# Altium footprint library General.PCBLIB: 130 footprints (part 8 of 9)
Each footprint in its own frame and in the unit in brackets; x right, y up, seen from the top. Pads: shape width x height; smd on the part's side, far side on the other; paste and mask are expansions set on the pad; w line width, h text height; cw(c..) or ccw(c..) is an arc to the next point about the centre after c.
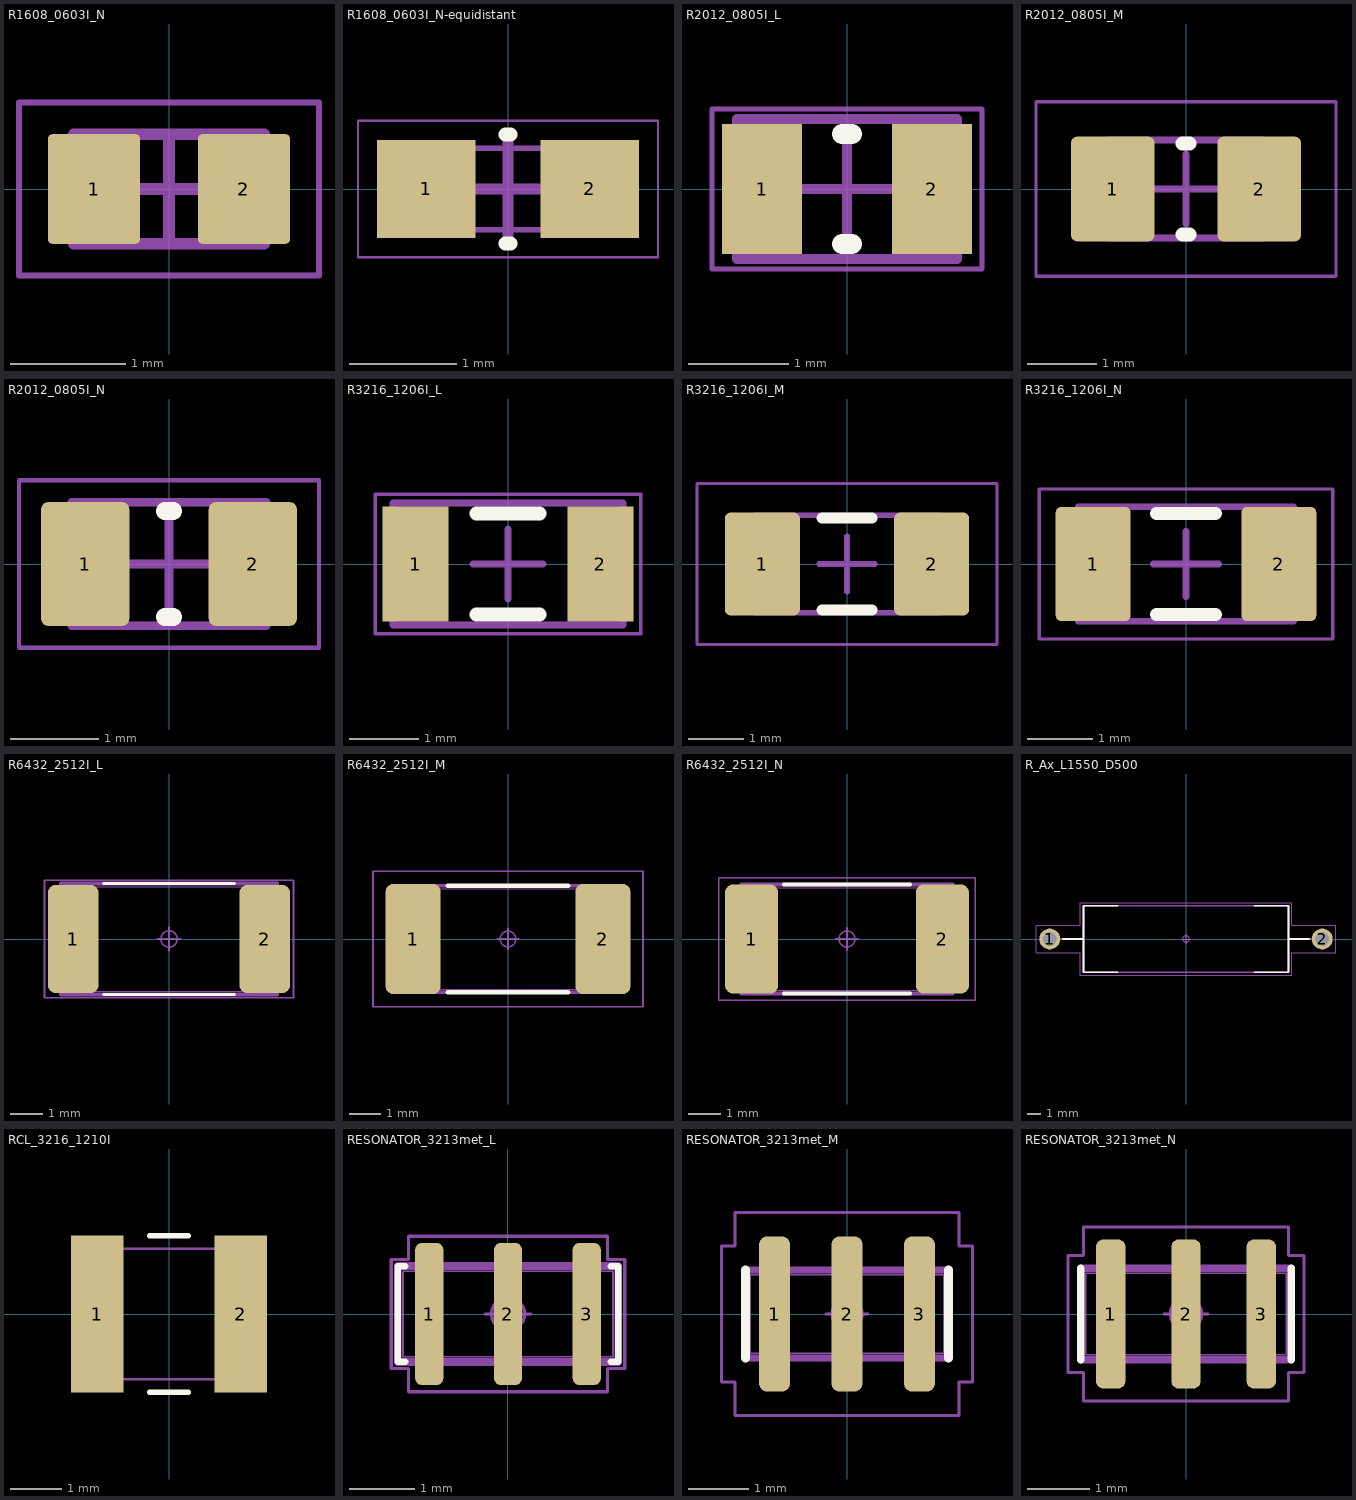
[diagram p7: the footprints below, top view; thin cyan lines are the x and y axes]

## R1608_0603I_N [mm] "Chip Resistor, 2-Leads, Body 1.57x0.85mm, IPC Medium Density"
height 0.5
pads (2):
  rrect10% 0.8x0.95 smd: 1(-0.65,0) 2(0.65,0)
Top Body, 3D Models:
  lines w0.1: -0.825,-0.475 -0.825,0.475 0.825,0.475 0.825,-0.475 -0.825,-0.475
Top Courtyard:
  lines w0.05: -1.3,-0.75 -1.3,0.75 1.3,0.75 1.3,-0.75 -1.3,-0.75
  lines w0.1: -0.475,0 0.475,0 ; 0,-0.475 0,0.475
Top DesignatorDoc:
  text ".Designator" at 0,0 h0.5
3D body "R0603(1608)_N.step": height 0.5, standoff 0, extent -0.825,-0.475 0.825,0.475

## R1608_0603I_N-equidistant [mil] "Chip Resistor, 2-Leads, Body 1.57x0.85mm, IPC Medium Density"
height 19.68
pads (2):
  rect 36x36 smd: 1(-30,0.01) 2(30,0.01)
Top Overlay:
  lines w5: -1,-20 1,-20 ; -1,20 1,20
Top Body, 3D Models:
  lines w2: -30,-15 -30,15 30,15 30,-15 -30,-15
Top Courtyard:
  lines w0.79: -55,-25 55,-25 55,25 -55,25 -55,-25
  lines w3.94: -18.7,0 18.7,0 ; 0,-18.7 0,18.7
Top DesignatorDoc:
  text ".Designator" at 0,0 h19.68
3D body "User Library-R_0603.step": height 19.68, standoff 0, extent -31.49,-17.71 31.5,17.72

## R2012_0805I_L [mm] "Chip Resistor, 2-Leads, Body 2.05x1.25mm, IPC High Density"
height 0.8
pads (2):
  rect 0.8x1.3 smd: 1(-0.85,0) 2(0.85,0)
Top Overlay:
  lines w0.2: -0.05,-0.55 0.05,-0.55 ; -0.05,0.55 0.05,0.55
Top Body, 3D Models:
  lines w0.1: -1.1,-0.7 -1.1,0.7 1.1,0.7 1.1,-0.7 -1.1,-0.7
Top Courtyard:
  lines w0.05: -1.35,-0.8 -1.35,0.8 1.35,0.8 1.35,-0.8 -1.35,-0.8
  lines w0.1: -0.5,0 0.5,0 ; 0,-0.5 0,0.5
Top DesignatorDoc:
  text ".Designator" at 0,0 h0.8
3D body "RES0805_L.step": height 0.8, standoff 0, extent -1.1,-0.7 1.1,0.7

## R2012_0805I_M [mm] "Chip Resistor, 2-Leads, Body 2.05x1.25mm, IPC Low Density"
height 0.8
pads (2):
  rrect15% 1.2x1.5 smd: 1(-1.05,0) 2(1.05,0)
Top Overlay:
  lines w0.2: -0.05,-0.65 0.05,-0.65 ; -0.05,0.65 0.05,0.65
Top Body, 3D Models:
  lines w0.1: -1.1,-0.7 1.1,-0.7 1.1,0.7 -1.1,0.7 -1.1,-0.7
Top Courtyard:
  lines w0.05: -2.15,-1.25 2.15,-1.25 2.15,1.25 -2.15,1.25 -2.15,-1.25
  lines w0.1: -0.5,0 0.5,0 ; 0,-0.5 0,0.5
Top DesignatorDoc:
  text ".Designator" at 0,0 h0.8
3D body "R0805_M.step": height 0.8, standoff 0, extent -1.1,-0.7 1.1,0.7

## R2012_0805I_N [mm] "Chip Resistor, 2-Leads, Body 2.05x1.25mm, IPC Medium Density"
height 0.8
pads (2):
  rrect15% 1x1.4 smd: 1(-0.95,0) 2(0.95,0)
Top Overlay:
  lines w0.2: -0.05,-0.6 0.05,-0.6 ; -0.05,0.6 0.05,0.6
Top Body, 3D Models:
  lines w0.1: -1.1,-0.7 1.1,-0.7 1.1,0.7 -1.1,0.7 -1.1,-0.7
Top Courtyard:
  lines w0.05: -1.7,-0.95 1.7,-0.95 1.7,0.95 -1.7,0.95 -1.7,-0.95
  lines w0.1: -0.5,0 0.5,0 ; 0,-0.5 0,0.5
Top DesignatorDoc:
  text ".Designator" at 0,0 h0.8
3D body "R0805_N.step": height 0.8, standoff 0, extent -1.1,-0.7 1.1,0.7

## R3216_1206I_L [mm] "Chip Resistor, 2-Leads, Body 3.15x1.60mm, IPC High Density"
height 0.6
pads (2):
  rect 0.95x1.65 smd: 1(-1.325,0) 2(1.325,0)
Top Overlay:
  lines w0.2: -0.45,-0.725 0.45,-0.725 ; -0.45,0.725 0.45,0.725
Top Body, 3D Models:
  lines w0.1: -1.65,-0.875 -1.65,0.875 1.65,0.875 1.65,-0.875 -1.65,-0.875
Top Courtyard:
  lines w0.05: -1.9,-1 -1.9,1 1.9,1 1.9,-1 -1.9,-1
  lines w0.1: -0.5,0 0.5,0 ; 0,-0.5 0,0.5
Top DesignatorDoc:
  text ".Designator" at 0,0 h1.2
3D body "R1206(3216)_L.step": height 0.6, standoff 0, extent -1.65,-0.875 1.65,0.875

## R3216_1206I_M [mm] "Chip Resistor, 2-Leads, Body 3.15x1.60mm, IPC Low Density"
height 0.6
pads (2):
  rrect15% 1.35x1.85 smd: 1(-1.525,0) 2(1.525,0)
Top Overlay:
  lines w0.2: -0.45,-0.825 0.45,-0.825 ; -0.45,0.825 0.45,0.825
Top Body, 3D Models:
  lines w0.1: -1.65,-0.875 -1.65,0.875 1.65,0.875 1.65,-0.875 -1.65,-0.875
Top Courtyard:
  lines w0.05: -2.7,-1.45 -2.7,1.45 2.7,1.45 2.7,-1.45 -2.7,-1.45
  lines w0.1: -0.5,0 0.5,0 ; 0,-0.5 0,0.5
Top DesignatorDoc:
  text ".Designator" at 0,0 h1.2
3D body "R1206(3216)_M.step": height 0.6, standoff 0, extent -1.65,-0.875 1.65,0.875

## R3216_1206I_N [mm] "Chip Resistor, 2-Leads, Body 3.15x1.60mm, IPC Medium Density"
height 0.6
pads (2):
  rrect15% 1.15x1.75 smd: 1(-1.425,0) 2(1.425,0)
Top Overlay:
  lines w0.2: -0.45,-0.775 0.45,-0.775 ; -0.45,0.775 0.45,0.775
Top Body, 3D Models:
  lines w0.1: -1.65,-0.875 -1.65,0.875 1.65,0.875 1.65,-0.875 -1.65,-0.875
Top Courtyard:
  lines w0.05: -2.25,-1.15 -2.25,1.15 2.25,1.15 2.25,-1.15 -2.25,-1.15
  lines w0.1: -0.5,0 0.5,0 ; 0,-0.5 0,0.5
Top DesignatorDoc:
  text ".Designator" at 0,0 h1.2
3D body "R1206(3216)_N.step": height 0.6, standoff 0, extent -1.65,-0.875 1.65,0.875

## R6432_2512I_L [mm] "Resistor, Chip; 6.40 mm L X 3.20 mm W X 0.75 mm H body"
height 0.75
pads (2):
  rrect32% 1.56x3.32 smd: 1(-2.93,0) 2(2.93,0)
Top Overlay:
  lines w0.1: -2,-1.7 2,-1.7 ; -2,1.7 2,1.7
Top Dimensions:
  lines w0.12: -3.3,-1.7 3.3,-1.7 3.3,1.7 -3.3,1.7 -3.3,-1.7
Bottom Dimensions:
  lines w0.025: -3.2,-1.6 3.2,-1.6 ; -3.2,-1.6 -3.2,1.6 ; -3.2,-1.6 -3.2,1.6 ; -3.2,-1.6 -2.3,-1.6 -2.3,1.6 -3.2,1.6 ; -3.2,1.6 3.2,1.6 ; 3.2,-1.6 3.2,1.6 ; 3.2,-1.6 2.3,-1.6 2.3,1.6 3.2,1.6 ; 3.2,-1.6 3.2,1.6
Top Courtyard:
  circle w0.05: c0,0 r0.25
  lines w0.05: -0.35,0 0.35,0 ; 0,-0.35 0,0.35 ; -3.81,-1.8 3.81,-1.8 3.81,1.8 -3.81,1.8 -3.81,-1.8
Top DesignatorDoc:
  text ".Designator" at 0,0 h1
3D body "R2512_6432_L.STEP": height 0.75, standoff 0, extent -3.2,-1.6 3.2,1.6

## R6432_2512I_M [mm] "Resistor, Chip; 6.40 mm L X 3.20 mm W X 0.75 mm H body"
height 0.75
pads (2):
  rrect28% 1.76x3.52 smd: 1(-3.03,0) 2(3.03,0)
Top Overlay:
  lines w0.15: -1.925,-1.7 1.925,-1.7 ; -1.925,1.7 1.925,1.7
Top Dimensions:
  lines w0.12: -3.3,-1.7 -3.3,1.7 3.3,1.7 3.3,-1.7 -3.3,-1.7
Bottom Dimensions:
  lines w0.025: -3.2,-1.6 -2.3,-1.6 -2.3,1.6 -3.2,1.6 ; -3.2,-1.6 -3.2,1.6 ; -3.2,-1.6 -3.2,1.6 ; -3.2,-1.6 3.2,-1.6 ; -3.2,1.6 3.2,1.6 ; 3.2,-1.6 3.2,1.6 ; 3.2,-1.6 2.3,-1.6 2.3,1.6 3.2,1.6 ; 3.2,-1.6 3.2,1.6
Top Courtyard:
  circle w0.05: c0,0 r0.25
  lines w0.05: -0.35,0 0.35,0 ; 0,-0.35 0,0.35 ; -4.31,-2.16 -4.31,2.16 4.31,2.16 4.31,-2.16 -4.31,-2.16
Top DesignatorDoc:
  text ".Designator" at 0,0 h1.5
3D body "R2512_6432_M.STEP": height 0.75, standoff 0, extent -3.2,-1.6 3.2,1.6

## R6432_2512I_N [mm] "Resistor, Chip; 6.40 mm L X 3.20 mm W X 0.75 mm H body"
height 0.75
pads (2):
  rrect30% 1.66x3.42 smd: 1(-2.98,0) 2(2.98,0)
Top Overlay:
  lines w0.12: -1.97,-1.7 1.97,-1.7 ; -1.97,1.7 1.97,1.7
Top Dimensions:
  lines w0.12: -3.3,-1.7 3.3,-1.7 3.3,1.7 -3.3,1.7 -3.3,-1.7
Bottom Dimensions:
  lines w0.025: -3.2,-1.6 3.2,-1.6 ; -3.2,-1.6 -3.2,1.6 ; -3.2,-1.6 -3.2,1.6 ; -3.2,-1.6 -2.3,-1.6 -2.3,1.6 -3.2,1.6 ; -3.2,1.6 3.2,1.6 ; 3.2,-1.6 3.2,1.6 ; 3.2,-1.6 2.3,-1.6 2.3,1.6 3.2,1.6 ; 3.2,-1.6 3.2,1.6
Top Courtyard:
  circle w0.05: c0,0 r0.25
  lines w0.05: -0.35,0 0.35,0 ; 0,-0.35 0,0.35 ; -4.01,-1.91 4.01,-1.91 4.01,1.91 -4.01,1.91 -4.01,-1.91
Top DesignatorDoc:
  text ".Designator" at 0,0 h1.2
3D body "R2512_6432_N.STEP": height 0.75, standoff 0, extent -3.2,-1.6 3.2,1.6

## R_Ax_L1550_D500 [mm] "Resistor, Axial; 20.60 mm C X 0.80 mm W 15.50 mm L X 5.00 mm Dia body"
height 5.1
pads (2):
  round 1.58 hole 1.05 paste-1.58: 1(-10.3,0) 2(10.3,0)
Top Overlay:
  lines w0.12: -9.33,0 -7.75,0 ; -5.17,-2.5 -7.75,-2.5 -7.75,2.5 -5.17,2.5 ; 5.17,-2.5 7.75,-2.5 7.75,2.5 5.17,2.5 ; 7.75,0 9.33,0
Top Dimensions:
  lines w0.12: -9.51,0 -7.75,0 ; 7.75,0 9.51,0 ; -7.75,-2.5 7.75,-2.5 7.75,2.5 -7.75,2.5 -7.75,-2.5
Bottom Dimensions:
  circle w0.025: c10.3,0 r0.425
  circle w0.025: c-10.3,0 r0.425
  lines w0.025: -7.75,-2.5 7.75,-2.5 7.75,2.5 -7.75,2.5 -7.75,-2.5
Top Courtyard:
  circle w0.05: c0,0 r0.25
  lines w0.05: -0.35,0 0.35,0 ; 0,-0.35 0,0.35 ; -11.34,-1.04 -8,-1.04 -8,-2.75 8,-2.75 8,-1.04 11.34,-1.04 11.34,1.04 8,1.04 8,2.75 -8,2.75 -8,1.04 -11.34,1.04 -11.34,-1.04
Top DesignatorDoc:
  text ".Designator" at 0,0 h1.2
3D body "R_Ax_L1550_D500.STEP": height 5.1, standoff -2, extent -10.7,-2.5 10.7,2.5

## RCL_3216_1210I [mil]
pads (2):
  rect 40x120 smd: 1(-55,0) 2(55,0)
Top Overlay:
  lines w4: -14.76,-60.04 14.76,-60.04 ; -14.76,60.04 14.76,60.04
Board Outline:
  lines w1.97: -65,-50 -65,50 65,50 65,-50 -65,-50
Top DesignatorDoc:
  text ".Designator" at 0,0 h47.24

## RESONATOR_3213met_L [mm] "Oscillator, Side Concave, 1.20 mm pitch; 6 pin, 3.20 mm L X 1.30 mm W X 0.80 mm H body"
height 0.8
pads (3):
  rrect51% 0.43x2.17 smd: 1(-1.2,0) 2(0,0) 3(1.2,0)
Top Overlay:
  lines w0.1: -1.565,-0.73 -1.68,-0.73 -1.68,0.73 -1.565,0.73 ; 1.565,-0.73 1.68,-0.73 1.68,0.73 1.565,0.73
Top Dimensions:
  lines w0.12: -1.68,-0.73 1.68,-0.73 1.68,0.73 -1.68,0.73 -1.68,-0.73
Bottom Dimensions:
  lines w0.025: -1.6,-0.65 1.6,-0.65 1.6,0.65 -1.6,0.65 -1.6,-0.65 ; -1.4,-0.65 -1.4,0.65 -1,0.65 -1,-0.65 -1.4,-0.65 ; -0.2,-0.65 -0.2,0.65 0.2,0.65 0.2,-0.65 -0.2,-0.65 ; 1,-0.65 1,0.65 1.4,0.65 1.4,-0.65 1,-0.65
Top Courtyard:
  circle w0.05: c0,0 r0.25
  lines w0.05: -0.35,0 0.35,0 ; 0,-0.35 0,0.35 ; -1.78,-0.83 -1.515,-0.83 -1.515,-1.185 1.515,-1.185 1.515,-0.83 1.78,-0.83 1.78,0.83 1.515,0.83 1.515,1.185 -1.515,1.185 -1.515,0.83 -1.78,0.83 -1.78,-0.83
Top DesignatorDoc:
  text ".Designator" at 0,0 h1
3D body "RESONATOR_3213met_L.STEP": height 0.8, standoff 0, extent -1.6,-0.7 1.6,0.7

## RESONATOR_3213met_M [mm] "Oscillator, Side Concave, 1.20 mm pitch; 6 pin, 3.20 mm L X 1.30 mm W X 0.80 mm H body"
height 0.8
pads (3):
  rrect51% 0.51x2.57 smd: 1(-1.2,0) 2(0,0) 3(1.2,0)
Top Overlay:
  lines w0.15: -1.68,-0.73 -1.68,0.73 ; 1.68,-0.73 1.68,0.73
Top Dimensions:
  lines w0.12: -1.68,-0.73 1.68,-0.73 1.68,0.73 -1.68,0.73 -1.68,-0.73
Bottom Dimensions:
  lines w0.025: -1.6,-0.65 1.6,-0.65 1.6,0.65 -1.6,0.65 -1.6,-0.65 ; -1.4,-0.65 -1.4,0.65 -1,0.65 -1,-0.65 -1.4,-0.65 ; -0.2,-0.65 -0.2,0.65 0.2,0.65 0.2,-0.65 -0.2,-0.65 ; 1,-0.65 1,0.65 1.4,0.65 1.4,-0.65 1,-0.65
Top Courtyard:
  circle w0.05: c0,0 r0.25
  lines w0.05: -0.35,0 0.35,0 ; 0,-0.35 0,0.35 ; -2.08,-1.13 -1.855,-1.13 -1.855,-1.685 1.855,-1.685 1.855,-1.13 2.08,-1.13 2.08,1.13 1.855,1.13 1.855,1.685 -1.855,1.685 -1.855,1.13 -2.08,1.13 -2.08,-1.13
Top DesignatorDoc:
  text ".Designator" at 0,0 h1.5
3D body "RESONATOR_3213met_M.STEP": height 0.8, standoff 0, extent -1.6,-0.7 1.6,0.7

## RESONATOR_3213met_N [mm] "Oscillator, Side Concave, 1.20 mm pitch; 6 pin, 3.20 mm L X 1.30 mm W X 0.80 mm H body"
height 0.8
pads (3):
  rrect51% 0.47x2.38 smd: 1(-1.2,0) 2(0,0) 3(1.2,0)
Top Overlay:
  lines w0.12: -1.68,-0.73 -1.68,0.73 ; 1.68,-0.73 1.68,0.73
Top Dimensions:
  lines w0.12: -1.68,-0.73 -1.68,0.73 1.68,0.73 1.68,-0.73 -1.68,-0.73
Bottom Dimensions:
  lines w0.025: -1.6,-0.65 -1.6,0.65 1.6,0.65 1.6,-0.65 -1.6,-0.65 ; -1.4,-0.65 -1,-0.65 -1,0.65 -1.4,0.65 -1.4,-0.65 ; -0.2,-0.65 0.2,-0.65 0.2,0.65 -0.2,0.65 -0.2,-0.65 ; 1,-0.65 1.4,-0.65 1.4,0.65 1,0.65 1,-0.65
Top Courtyard:
  circle w0.05: c0,0 r0.25
  lines w0.05: -0.35,0 0.35,0 ; 0,-0.35 0,0.35 ; -1.88,-0.93 -1.88,0.93 -1.635,0.93 -1.635,1.385 1.635,1.385 1.635,0.93 1.88,0.93 1.88,-0.93 1.635,-0.93 1.635,-1.385 -1.635,-1.385 -1.635,-0.93 -1.88,-0.93
Top DesignatorDoc:
  text ".Designator" at 0,0 h1.2
3D body "RESONATOR_3213met_N.STEP": height 0.8, standoff 0, extent -1.6,-0.7 1.6,0.7